# Altium footprint library Prosthetic Hand Component Library.PcbLib: 36 footprints (part 2 of 3)
Each footprint in its own frame and in the unit in brackets; x right, y up, seen from the top. Pads: shape width x height; smd on the part's side, far side on the other; paste and mask are expansions set on the pad; w line width, h text height; cw(c..) or ccw(c..) is an arc to the next point about the centre after c.
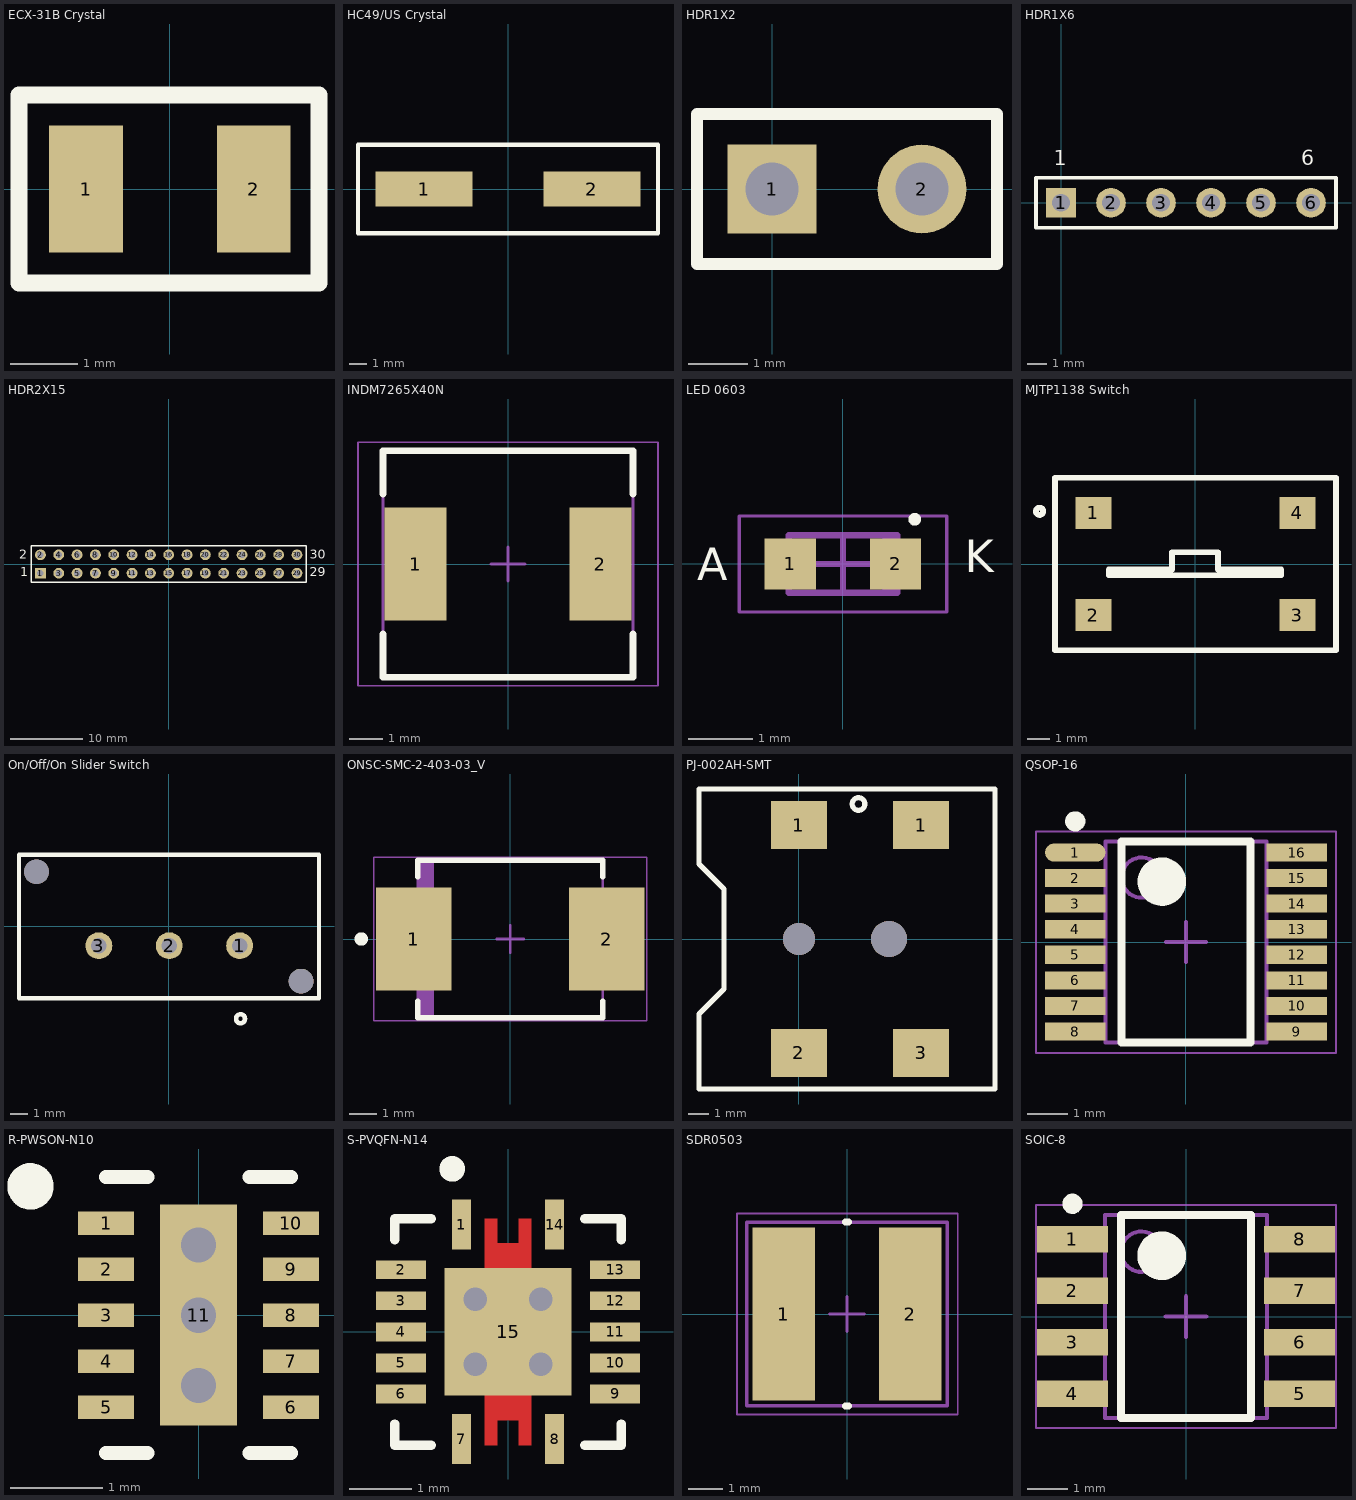
[diagram p1: the footprints below, top view; thin cyan lines are the x and y axes]

## ECX-31B Crystal [mm]
pads (2):
  rect 1.1x1.9 smd: 1(-1.25,0) 2(1.25,0)
Top Overlay:
  lines w0.254: -2.25,-1.4 2.225,-1.4 2.225,1.4 -2.25,1.4 -2.25,-1.4
3D body "User Library-ECX-31B.STEP": height 0.9, standoff 0, extent -1.6,-0.75 1.6,0.75

## HC49/US Crystal [mm]
pads (2):
  rect 5.5x2 smd: 1(-4.75,0) 2(4.75,0)
Top Overlay:
  lines w0.254: -8.5,-2.5 -8.5,2.5 8.5,2.5 8.5,-2.5 -8.5,-2.5
3D body "User Library-Crystal HC49_US-SM.step": height 4.3, standoff 0, extent -6.4,-2.415 6.4,2.415

## HDR1X2 [mm] "Connector; Header; 2 Position"
pads (2):
  rect 1.5x1.5 hole 0.9: 1(0,0)
  round 1.5 hole 0.9: 2(2.54,0)
Top Overlay:
  lines w0.2: -1.27,-1.27 -1.27,1.27 3.81,1.27 3.81,-1.27 -1.27,-1.27
3D body "969102-0000-DA.stp": height 13.5, standoff 0.3, extent -1.27,-1.27 3.73,1.13
3D body "_ _C02SAAN.STEP": height 8.13, standoff -3.3, extent -1.27,-1.27 3.81,1.27

## HDR1X6 [mm] "Connector; Header; 6 Position"
pads (6):
  rect 1.5x1.5 hole 0.9: 1(0,0)
  round 1.5 hole 0.9: 2(2.54,0) 3(5.08,0) 4(7.62,0) 5(10.16,0) 6(12.7,0)
Top Overlay:
  lines w0.2: -1.27,-1.27 -1.27,1.27 13.97,1.27 13.97,-1.27 -1.27,-1.27
  text "1" at -0.381,1.905 h0.76
  text "6" at 12.192,1.905 h0.76
3D body "c-3-644456-6-j-3d.stp": height 10.03, standoff -2.79, extent -1.12,-1.168 13.82,1.169

## HDR2X15 [mm] "Connector; Header; 15x2 Position"
pads (30):
  rect 1.5x1.5 hole 0.9: 1(-17.78,-1.27)
  round 1.5 hole 0.9: 2(-17.78,1.27) 3(-15.24,-1.27) 4(-15.24,1.27) 5(-12.7,-1.27) 6(-12.7,1.27) 7(-10.16,-1.27) 8(-10.16,1.27) 9(-7.62,-1.27) 10(-7.62,1.27) 11(-5.08,-1.27) 12(-5.08,1.27) 13(-2.54,-1.27) 14(-2.54,1.27) 15(0,-1.27) 16(0,1.27) 17(2.54,-1.27) 18(2.54,1.27) 19(5.08,-1.27) 20(5.08,1.27) 21(7.62,-1.27) 22(7.62,1.27) 23(10.16,-1.27) 24(10.16,1.27) 25(12.7,-1.27) 26(12.7,1.27) 27(15.24,-1.27) 28(15.24,1.27) 29(17.78,-1.27) 30(17.78,1.27)
Top Overlay:
  lines w0.2: -19.05,-2.54 -19.05,2.54 19.05,2.54 19.05,-2.54 -19.05,-2.54
  text "30" at 19.558,0.762 h1.27
  text "29" at 19.558,-1.727 h1.27
  text "2" at -20.752,0.737 h1.27
  text "1" at -20.574,-1.727 h1.27
3D body "SSW-115-01-T-D.stp": height 8.51, standoff -2.64, extent -19.304,-2.515 19.304,2.439

## INDM7265X40N [mm] "Molded Inductor, 2-Leads, Body 7.20x6.50mm, IPC Medium Density"
height 4
pads (2):
  rect 1.85x3.4 smd: 1(-2.775,0) 2(2.775,0)
Top Overlay:
  lines w0.2: -3.75,-2.1 -3.75,-3.4 3.75,-3.4 3.75,-2.1 ; -3.75,2.1 -3.75,3.4 3.75,3.4 3.75,2.1
Mechanical 13:
  lines w0.1: -3.75,-3.35 3.75,-3.35 3.75,3.35 -3.75,3.35 -3.75,-3.35
Mechanical 15:
  lines w0.05: -4.5,-3.65 4.5,-3.65 4.5,3.65 -4.5,3.65 -4.5,-3.65
  lines w0.1: -0.5,0 0.5,0 ; 0,-0.5 0,0.5
3D body "SRP6540.stp": height 3.98, standoff -0.01, extent -3.594,-3.226 3.594,3.277

## LED 0603 [mm] "Rohm SML-D12M8WT86"
height 0.65
pads (2):
  rect 0.8x0.8 smd: 1(-0.825,0) 2(0.825,0)
Top Overlay:
  circle w0.1: c1.125,0.7 r0.05
  text "K" at 1.905,-0.127 h0.51
  text "A" at -2.286,-0.254 h0.51
Mechanical 13:
  rectangle: 0.621,-0.45 0.85,0.45
  lines w0.1: -0.85,-0.45 -0.85,0.45 0.85,0.45 0.85,-0.45 -0.85,-0.45
Mechanical 15:
  lines w0.05: -1.625,-0.75 -1.625,0.75 1.625,0.75 1.625,-0.75 -1.625,-0.75
  lines w0.1: -0.45,0 0.45,0 ; 0,-0.45 0,0.45
3D body: height 0.65, standoff 0, extent -0.85,-0.45 0.85,0.45

## MJTP1138 Switch [mm]
pads (4):
  rect 1.6x1.4 smd: 1(-4.5,2.25) 2(-4.5,-2.25) 3(4.5,-2.25) 4(4.5,2.25)
Top Overlay:
  circle w0.254: c-6.875,2.325 r0.158
  lines w0.042: -3.827,-0.24 -3.827,-0.494 3.79,-0.494 ; -1.034,-0.24 -1.034,0.524 0.997,0.524 0.997,-0.24 3.79,-0.24
  lines w0.254: -6.2,-3.8 -6.2,3.8 6.2,3.8 6.2,-3.8 -6.2,-3.8 ; -3.827,-0.494 -3.827,-0.24 -1.034,-0.24 -1.034,0.524 0.997,0.524 0.997,-0.24 3.79,-0.24 3.79,-0.494 -3.827,-0.494
3D body "User Library-MJTP1138BTR.step": height 9.1, standoff 0, extent -4.5,-3 4.501,3

## On/Off/On Slider Switch [mil] "TE Connectivity 1825255-5"
pads (5):
  round 60 hole 35: 1(158,-43) 2(1,-43) 3(-156,-43)
  round 55 hole 55 unplated mask+7: ""(-295,122) ""(295,-122)
Top Overlay:
  circle w10: c160,-206 r10.05
  lines w10: -334,-160 -334,160 335,160 335,-160 -334,-160
3D body "c-1825255-5-a-3d.stp": height 473.17, standoff -137.07, extent -314.96,-130.9 314.96,132.88

## ONSC-SMC-2-403-03_V [mil] "Molded, 2-Leads, Body 6.86x5.84mm"
height 99.02
pads (2):
  rect 110x150 smd: 1(-140.49,0) 2(140.49,0)
Top Overlay:
  circle w9.84: c-217.15,0 r4.92
  lines w7.87: -135.04,-90.75 -135.04,-114.96 135.04,-114.96 135.04,-90.75 ; -135.04,90.75 -135.04,114.96 135.04,114.96 135.04,90.75
Mechanical 13:
  rectangle: -135.45,-114.96 -111.25,114.96
  lines w3.94: -135.04,-114.96 135.04,-114.96 135.04,114.96 -135.04,114.96 -135.04,-114.96
Mechanical 15:
  lines w1.97: -199.43,-118.9 199.43,-118.9 199.43,118.9 -199.43,118.9 -199.43,-118.9
  lines w3.94: -19.68,0 19.69,0 ; 0,-19.68 0,19.68
3D body: height 99.02, standoff 1.97, extent -135.04,-114.96 135.04,114.96

## PJ-002AH-SMT [mm] "Conn power jack SMT 2.1mm x 5.5mm"
pads (6):
  rect 2.8x2.4 smd: 1(0,5.7) 1(6.1,5.7) 2(0,-5.7) 3(6.1,-5.7)
  round 1.6 hole 1.6 unplated mask+0.178: ""(0,0)
  round 1.8 hole 1.8 unplated mask+0.178: ""(4.496,0)
Top Overlay:
  circle w0.254: c2.975,6.75 r0.316
  lines w0.254: -5,-7.5 -5,-3.75 -3.75,-2.5 -3.75,2.5 -5,3.75 -5,7.5 9.8,7.5 9.8,3.75 9.8,1.875 9.8,-1.875 9.8,-3.75 9.8,-7.5 -5,-7.5
3D body "pj-002ah-smt.stp": height 11.18, standoff -1.02, extent -5,-6.3 9.8,6.3

## QSOP-16 [mm] "For MAX1873"
height 1.75
pads (16):
  oval 1.5x0.45 smd: 1(-2.75,2.222)
  rect 1.5x0.45 smd: 2(-2.75,1.587) 3(-2.75,0.953) 4(-2.75,0.318) 5(-2.75,-0.318) 6(-2.75,-0.953) 7(-2.75,-1.587) 8(-2.75,-2.222) 9(2.75,-2.222) 10(2.75,-1.587) 11(2.75,-0.953) 12(2.75,-0.318) 13(2.75,0.318) 14(2.75,0.953) 15(2.75,1.587) 16(2.75,2.222)
Top Overlay:
  circle w0.6: c-0.6,1.5 r0.3
  circle w0.25: c-2.75,2.997 r0.125
  lines w0.2: -1.6,-2.5 1.6,-2.5 1.6,2.5 -1.6,2.5 -1.6,-2.5
Mechanical 13:
  circle w0.1: c-1.1,1.6 r0.5
  lines w0.1: -2,-2.5 2,-2.5 2,2.5 -2,2.5 -2,-2.5
Mechanical 15:
  lines w0.05: -3.725,-2.75 3.725,-2.75 3.725,2.75 -3.725,2.75 -3.725,-2.75
  lines w0.1: -0.5,0 0.5,0 ; 0,-0.5 0,0.5
3D body "QSOP-16.step": height 1.75, standoff 0, extent -3.01,-2.5 3.01,2.5

## R-PWSON-N10 [mil]
pads (11):
  rect 24x10 smd paste-5: 1(-39.5,39.37) 2(-39.5,19.68) 3(-39.5,0) 4(-39.5,-19.68) 5(-39.5,-39.37) 6(39.5,-39.37) 7(39.5,-19.68) 8(39.5,0) 9(39.5,19.68) 10(39.5,39.37)
  rect 33.07x94.49 smd paste-46.5: 11(0,0)
via 0,-30 diameter 25 hole 15
via 0,30 diameter 25 hole 15
via 0,0 diameter 25 hole 15
Top Overlay:
  circle w10: c-71.85,55.12 r4.92
  lines w6: -39.5,-59 -21.75,-59 ; -39.5,59 -21.75,59 ; 21.75,-59 39.5,-59 ; 21.75,59 39.5,59
Top Paste:
  region: 16.5,47 -16.5,47 -16.5,-47 16.5,-47
3D body "User Library-10WSON.step": height 27, standoff -0.36, extent -59.51,-59.05 59,59.05

## S-PVQFN-N14 [mil]
pads (15):
  rect 12x31.68 smd: 1(-29.53,68.01) 7(-29.53,-68.01) 8(29.53,-68.01) 14(29.53,68.01)
  rect 31.68x12 smd: 2(-68.01,39.38) 3(-68.01,19.69) 4(-68.01,0) 5(-68.01,-19.69) 6(-68.01,-39.38) 9(68.01,-39.38) 10(68.01,-19.69) 11(68.01,0) 12(68.01,19.69) 13(68.01,39.38)
  rect 80.71x80.71 smd paste-39.85: 15(0,0)
via -20.67,-20.67 diameter 27 hole 15
via 20.67,-20.67 diameter 27 hole 15
via 20.67,20.67 diameter 27 hole 15
via -20.67,20.67 diameter 27 hole 15
Top Layer:
  region: -14.76,-40.35 14.76,-40.35 14.76,-71.85 6.89,-71.85 6.89,-56.1 -6.89,-56.1 -6.89,-71.85 -14.76,-71.85
  region: -14.76,40.35 14.76,40.35 14.76,71.85 6.89,71.85 6.89,56.1 -6.89,56.1 -6.89,71.85 -14.76,71.85
Top Overlay:
  circle w10: c-35.43,103.35 r3.11
  lines w6: -71.85,-58.48 -71.85,-71.85 -48.63,-71.85 ; -71.85,58.48 -71.85,71.85 -48.63,71.85 ; 48.63,-71.85 71.85,-71.85 71.85,-58.48 ; 48.63,71.85 71.85,71.85 71.85,58.48
Top Paste:
  region: -14.76,-40.35 -6.89,-40.35 -6.89,-71.85 -14.76,-71.85
  region: 6.89,-40.35 14.76,-40.35 14.76,-71.85 6.89,-71.85
  region: -14.76,40.35 -6.89,40.35 -6.89,71.85 -14.76,71.85
  region: 6.89,40.35 14.76,40.35 14.76,71.85 6.89,71.85
  region: 40.35,40.35 -40.35,40.35 -40.35,-40.35 40.35,-40.35
Top Solder:
  region: -14.76,-40.35 14.76,-40.35 14.76,-71.85 6.89,-71.85 6.89,-56.1 -6.89,-56.1 -6.89,-71.85 -14.76,-71.85
  region: -14.76,40.35 14.76,40.35 14.76,71.85 6.89,71.85 6.89,56.1 -6.89,56.1 -6.89,71.85 -14.76,71.85
3D body "User Library-QFN-14_Therm.STEP": height 39.37, standoff 0, extent -68.9,-68.8 68.9,69

## SDR0503 [mil]
height 129.92
pads (2):
  rect 71x197 smd: 1(-72,0) 2(72,0)
Top Overlay:
  lines w7.87: -1.97,-104.33 1.97,-104.33 ; -1.97,104.33 1.97,104.33
Mechanical 13:
  lines w3.94: -114,-104.33 -114,104.33 114,104.33 114,-104.33 -114,-104.33
Mechanical 15:
  lines w1.97: -125,-114.17 -125,114.17 126,114.17 126,-114.17 -125,-114.17
  lines w3.94: -19.69,0 19.68,0 ; 0,-19.68 0,19.68
3D body "sdr0503.stp": height 118.11, standoff 0, extent -98.42,-98.42 98.43,98.43

## SOIC-8 [mm] "SOIC, 8-Leads, Body 4.90x3.90mm, Pitch 1.27mm, IPC Medium Density"
height 1.75
pads (8):
  rect 1.75x0.65 smd: 1(-2.8,1.905) 2(-2.8,0.635) 3(-2.8,-0.635) 4(-2.8,-1.905) 5(2.8,-1.905) 6(2.8,-0.635) 7(2.8,0.635) 8(2.8,1.905)
Top Overlay:
  circle w0.25: c-2.8,2.78 r0.125
  circle w0.6: c-0.6,1.5 r0.3
  lines w0.2: -1.6,-2.5 -1.6,2.5 1.6,2.5 1.6,-2.5 -1.6,-2.5
Mechanical 13:
  circle w0.1: c-1.1,1.6 r0.5
  lines w0.1: -2,-2.5 -2,2.5 2,2.5 2,-2.5 -2,-2.5
Mechanical 15:
  lines w0.05: -3.7,-2.75 -3.7,2.75 3.7,2.75 3.7,-2.75 -3.7,-2.75
  lines w0.1: -0.5,0 0.5,0 ; 0,-0.5 0,0.5
3D body "SOIC-8.step": height 1.75, standoff 0, extent -3,-2.5 3,2.5